# Altium schematic symbol library Semi-ATE.SchLib: 322 symbols (part 3 of 6)
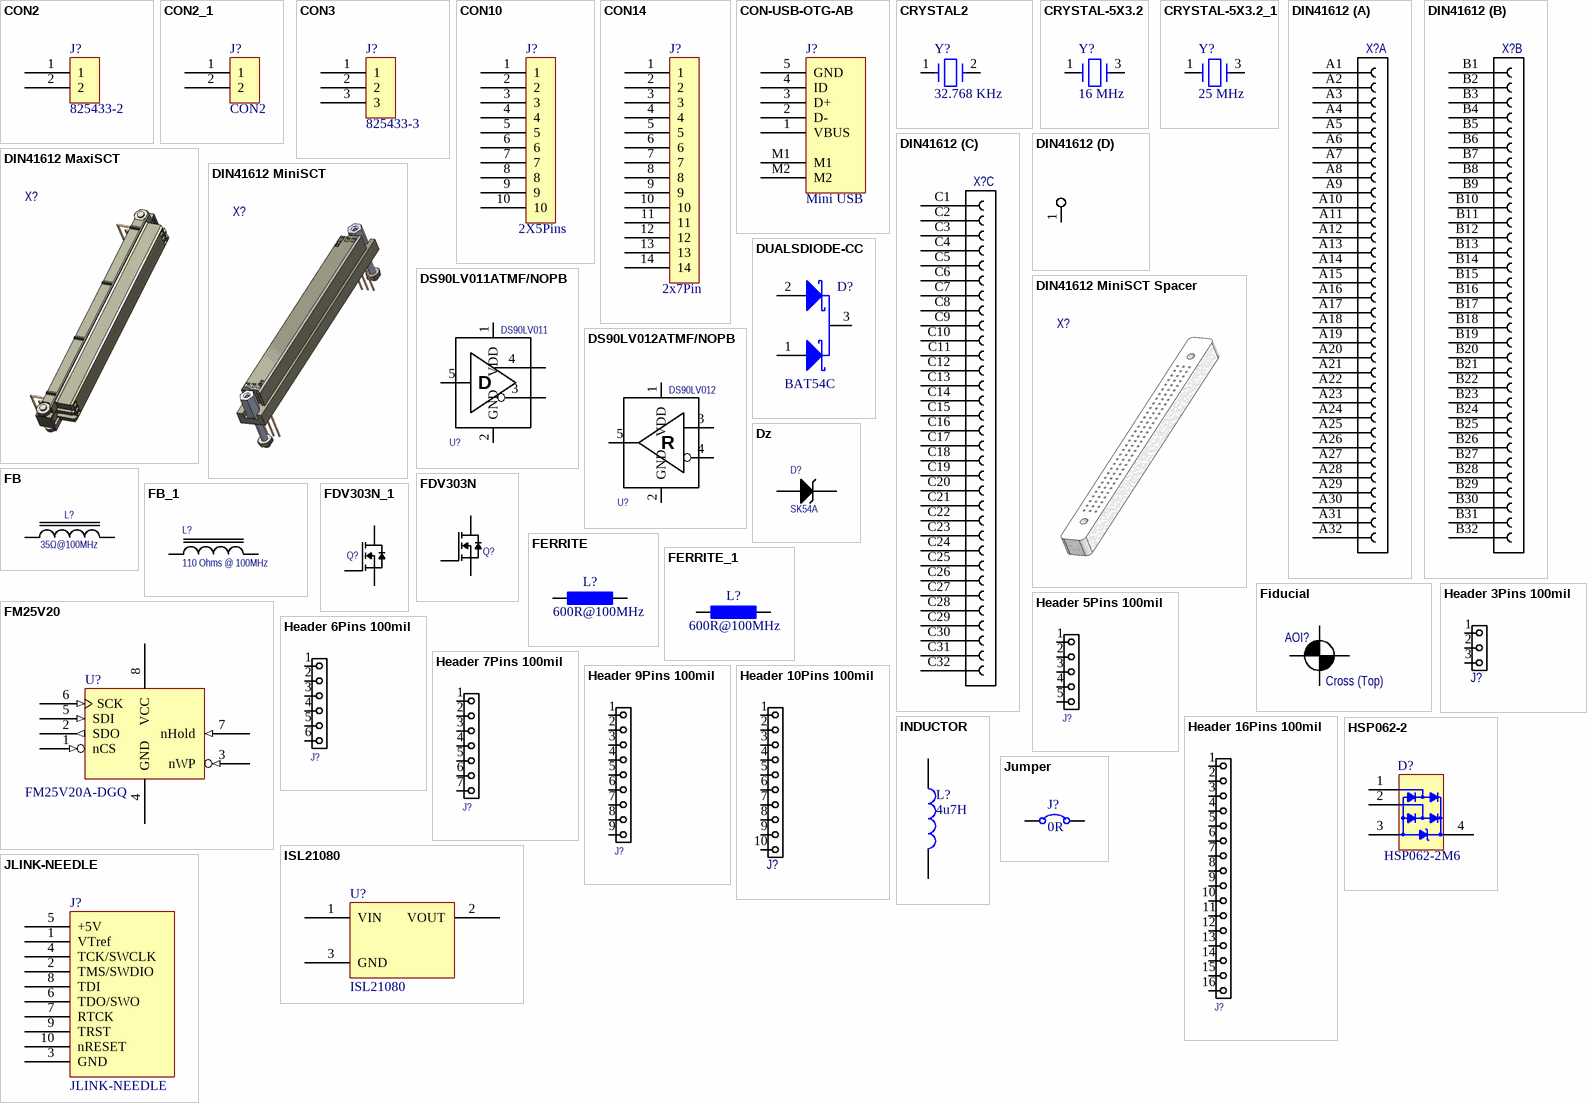
[diagram p21: symbols CON2 to Jumper]

## CON2_1
designator J?, comment NicName: CON2  (hidden comment: J)
CONN HEADER VERT 2POS 2.54MM + Lock; MFR-PN: 825433-2; MFR: TYCO; 04. Manufacturer: Molex; 07. Manufacturer  Part Number: 0022112022; POPULATED: no; 03. Unit Price: 0.35; 3D-Export: No; 01. Distributor: DigiKey; 02. Distributor Part Number: WM2700-ND; 11. RoHS: YES; ComponentLink4Description: Info; ComponentLink4URL: https://www.digikey.de/products/en/connectors-interconnects/rectangular-connectors-headers-male-pins/314?k=22112022; ComponentLink5Description: DataSheet; ComponentLink5URL: https://www.molex.com/pdm_docs/sd/022112022_sd.pdf
footprint MOLEX-22-11-2022
footprint TSW-1X2
pins: 1, 2

## CON3
designator J?, comment 07. Manufacturer  Part Number: 825433-3  (hidden comment: J)
CONN HEADER VERT 3POS 2.54MM; MFR: TYCO; 04. Manufacturer: TE Connectivity AMP Connectors; POPULATED: no; 03. Unit Price: 0.54; 3D-Export: No; MFR-PN: 825433-3; 01. Distributor: DigiKey; 02. Distributor Part Number: A106465-ND; 09. Operating Temperature: -65°C ~ 105°C; 11. RoHS: YES; ComponentLink4Description: Info; ComponentLink4URL: https://www.digikey.de/products/en/connectors-interconnects/rectangular-connectors-headers-male-pins/314?k=825433-2&k=&pkeyword=825433-2&sv=0&pv88=2&sf=0&quantity=&ColumnSort=0&page=1&pageSize=25; ComponentLink5Description: DataSheet; ComponentLink5URL: https://www.te.com/commerce/DocumentDelivery/DDEController?Action=srchrtrv&DocNm=825433&DocType=Customer+Drawing&DocLang=English
footprint TSW-1X3 (Footprint not found)
pins: 1, 2, 3

## CON10
designator J?, comment NicName: 2X5Pins  (hidden comment: J)
CONN HEADER VERT 10POS 2.54MM; MFR-PN: 09 18 510 6324; MFR: HARTING; 07. Manufacturer  Part Number: 09185106324; POPULATED: yes; 03. Unit Price: 1.34; 3D-Export: No; 01. Distributor: DigiKey; 02. Distributor Part Number: 1195-1672-ND; 04. Manufacturer: HARTING; 09. Operating Temperature: -55°C ~ 125°C; 11. RoHS: YES; ComponentLink4Description: Info; ComponentLink4URL: https://www.digikey.de/products/en/connectors-interconnects/rectangular-connectors-headers-male-pins/314?k=09%2018%20510%206324; ComponentLink5Description: DataSheet; ComponentLink5URL: https://b2b.harting.com/files/download/PRD/PDF_TS/09185XXX324_100154466DRW008A.pdf
footprint SEK10GW
pins: 1, 2, 3, 4, 5, 6, 7, 8, 9, 10

## CON14
designator J?, comment NicName: 2x7Pin  (hidden comment: J)
CONN HEADER VERT 14POS 2MM; MFR: SAMTEC; MFR-PN: LTMM-107-02-F-D; MFR-TYPE: LTMM; 04. Manufacturer: Samtec Inc.; POPULATED: yes; 03. Unit Price: 2.07; 3D-Export: No; 01. Distributor: Samtec Inc.; 02. Distributor Part Number: LTMM-107-02-F-D; 07. Manufacturer  Part Number: LTMM-107-02-F-D; 11. RoHS: YES; ComponentLink4Description: Info; ComponentLink4URL: https://www.samtec.com/products/ltmm-107-02-f-d
footprint LTM-V-14
pins: 1, 2, 3, 4, 5, 6, 7, 8, 9, 10, 11, 12, 13, 14

## CON-USB-OTG-AB
designator J?, comment NicName: Mini USB  (hidden comment: J)
CONN RCPT USB2.0 MINI B VERT; MFR-PN: 0565790519; MFR: MOLEX; 07. Manufacturer  Part Number: 5000751517; POPULATED: yes; 03. Unit Price: 4.04; 3D-Export: No; Temperature Range: -20°C/+85°C; 01. Distributor: DigiKey; 02. Distributor Part Number: WM2072-ND; 04. Manufacturer: Molex; 09. Operating Temperature: -40°C ~ 85°C; 11. RoHS: YES; ComponentLink4Description: Info; ComponentLink4URL: https://www.digikey.de/products/en?keywords=WM2072-ND; ComponentLink5Description: DataSheet; ComponentLink5URL: https://www.molex.com/pdm_docs/sd/5000751517_sd.pdf
footprint MOLEX-5000751517
pins: 1 VBUS, 2 D-, 3 D+, 4 ID, 5 GND, M1, M2

## CRYSTAL2
designator Y?, comment value 32.768 KHz  (hidden comment: Y)
32.768 KHz XTAL; MFR: EUROQUARTZ; MFR-PN: PH32768S; POPULATED: yes; 03. Unit Price: 0.502; 3D-Export: No; Temperature Range: -40°C/+85°C; 01. Distributor: Farnell; 02. Distributor Part Number: 1641088; 04. Manufacturer: EUROQUARTZ; 07. Manufacturer  Part Number: PH32768S; 09. Operating Temperature: -40°C~+85°C; 11. RoHS: YES; ComponentLink4Description: Info; ComponentLink4URL: https://de.farnell.com/euroquartz/ph32768x/quarz-3x8mm-plt-32-768khz-12-5/dp/1641088?ost=1641088&ddkey=https%3Ade-DE%2FElement14_Germany%2Fsearch; ComponentLink5Description: DataSheet; ComponentLink5URL: http://www.farnell.com/datasheets/1322436.pdf?_ga=2.76528336.455496259.1554557825-1796319186.1516204025&_gac=1.191945176.1554557825.Cj0KCQjwnKHlBRDLARIsAMtMHDEqbRXRqjZhpdX2XgffLKCo5B_j81vh-gSBYYE2_w1VQzz4pZXVC3caAvMVEALw_wcB
footprint FC
pins: 1, 2

## CRYSTAL-5X3.2
designator Y?, comment value 16 MHz  (hidden comment: Y)
CRYSTAL 16.0000MHZ 18PF SMD; MFR: ABRACON; MFR-PN: ABM3B-16.000MHZ-B2-T; 04. Manufacturer: Abracon LLC; Parameters: CL=18pF, 50ppm; POPULATED: yes; 03. Unit Price: 0.56; 3D-Export: No; Temperature Range: -40°C/+85°C; 01. Distributor: DigiKey; 02. Distributor Part Number: 535-9122-6-ND; 07. Manufacturer  Part Number: ABM3B-16.000MHZ-B2-T; 09. Operating Temperature: -20°C ~ 70°C; 11. RoHS: YES; ComponentLink4Description: Info; ComponentLink4URL: https://www.digikey.de/products/en?keywords=535-9122-6-ND; ComponentLink5Description: DataSheet; ComponentLink5URL: https://abracon.com/Resonators/abm3b.pdf
footprint XTAL(Q)5x3.2
pins: 1, 3

## CRYSTAL-5X3.2_1
designator Y?, comment value 25 MHz  (hidden comment: Y)
CRYSTAL 25.0000MHZ 18PF SMD; MFR: ABRACON; MFR-PN: ABM3B-25.000MHZ-B2-T; 04. Manufacturer: Abracon LLC; POPULATED: yes; 03. Unit Price: 0.56; 3D-Export: No; 01. Distributor: DigiKey; 02. Distributor Part Number: 535-9128-6-ND; 07. Manufacturer  Part Number: ABM3B-25.000MHZ-B2-T; 09. Operating Temperature: -20°C ~ 70°C; 11. RoHS: YES; ComponentLink4Description: Info; ComponentLink4URL: https://www.digikey.de/products/en?keywords=535-9128-6-ND; ComponentLink5Description: DataSheet; ComponentLink5URL: https://abracon.com/Resonators/abm3b.pdf
footprint XTAL(Q)5x3.2
pins: 1, 3

## DIN41612
designator X?, comment X  (value not drawn)  (no BOM)
DIN-SIGNAL; 04. Manufacturer: Harting; 13. Created Date/Name: NOV2018 / Hören; System: Connector; 3D-Export: Yes; 01. Distributor: DigiKey
footprint DIN 41612
part A pins: A1, A2, A3, A4, A5, A6, A7, A8, A9, A10, A11, A12, A13, A14, A15, A16, A17, A18, A19, A20, A21, A22, A23, A24, A25, A26, A27, A28, A29, A30, A31, A32
part B pins: B1, B2, B3, B4, B5, B6, B7, B8, B9, B10, B11, B12, B13, B14, B15, B16, B17, B18, B19, B20, B21, B22, B23, B24, B25, B26, B27, B28, B29, B30, B31, B32
part C pins: C1, C2, C3, C4, C5, C6, C7, C8, C9, C10, C11, C12, C13, C14, C15, C16, C17, C18, C19, C20, C21, C22, C23, C24, C25, C26, C27, C28, C29, C30, C31, C32
part D pins: 1

## DIN41612 MaxiSCT
designator X?, comment X  (value not drawn)
DIN-SIGNAL R096FS-3,0C1-2; 04. Manufacturer: Harting; 07. Manufacturer  Part Number: 09732966801; 03. Unit Price: 4.33; 13. Created Date/Name: NOV2018 / Hören; System: Connector; 3D-Export: Yes; 01. Distributor: DigiKey; 02. Distributor Part Number: 1195-2893-ND; 11. RoHS: YES; ComponentLink1Description: Info; ComponentLink1URL: https://www.digikey.de/product-detail/en/harting/09732966801/1195-2893-ND/3181477; ComponentLink2Description: DataSheet; ComponentLink2URL: https://b2b.harting.com/files/download/PRD/PDF_TS/0973296X801_100104712DRW068A.pdf
footprint DIN 41612 MaxiSCT (09732966801)

## DIN41612 MiniSCT
designator X?, comment X  (value not drawn)
DIN-SIGNAL C096FPW-13,2C1-1; 04. Manufacturer: Harting; 07. Manufacturer  Part Number: 09032962861; 03. Unit Price: 8.81; 13. Created Date/Name: NOV2018 / Hören; System: Connector; 3D-Export: Yes; 01. Distributor: DigiKey; 02. Distributor Part Number: 1195-1192-ND; 09. Operating Temperature: -40°C ~ 105°C; 11. RoHS: YES; ComponentLink1Description: Info; ComponentLink1URL: https://www.digikey.de/products/en?keywords=09032962861; ComponentLink2Description: DataSheet; ComponentLink2URL: https://b2b.harting.com/files/download/PRD/PDF_TS/0903296X861_100072194DRW085D.pdf
footprint DIN 41612 MiniSCT (09032962861)

## DIN41612 MiniSCT Spacer
designator X?, comment X  (value not drawn)
DIN-SIGNAL C096FPW-13,2C1-1 Spacer; 04. Manufacturer: Likom; 03. Unit Price: 0; 13. Created Date/Name: NOV2018 / Hören; 3D-Export: Yes; 01. Distributor: N/A; 11. RoHS: YES; ComponentLink1Description: Info; ComponentLink1URL: https://www.digikey.de/products/en?keywords=09032962861; ComponentLink2Description: DataSheet; ComponentLink2URL: https://b2b.harting.com/files/download/PRD/PDF_TS/0903296X861_100072194DRW085D.pdf
footprint DIN 41612 MiniSCT Spacer (09032962861)

## DS90LV011ATMF/NOPB
designator U?, comment NicName: DS90LV011  (hidden comment: U)
1/0 Driver  LVDS SOT-23-5; 04. Manufacturer: Texas Instruments; 07. Manufacturer  Part Number: DS90LV011ATMF/NOPB; 03. Unit Price: 0.43; 13. Created Date/Name: AUG 2018 / Hören; 01. Distributor: DigiKey; 02. Distributor Part Number: DS90LV011ATMF/NOPBTR-ND; 11. RoHS: YES; ComponentLink1Description: Info; ComponentLink1URL: https://www.digikey.de/products/en?keywords=DS90LV011ATMF%2FNOPBTR-ND; ComponentLink2Description: DataSheet; ComponentLink2URL: https://www.ti.com/general/docs/suppproductinfo.tsp?distId=10&gotoUrl=http%3A%2F%2Fwww.ti.com%2Flit%2Fgpn%2Fds90lv011a; Package: SOT23-5
footprint SOT23-5 (SOT 23 5 lead)
pins: 1 VDD, 2 GND, 3 OUT-, 4 OUT+, 5 TTL_IN
text: D

## DS90LV012ATMF/NOPB
designator U?, comment NicName: DS90LV012  (hidden comment: U)
0/1 Receiver  LVDS SOT-23-5; 04. Manufacturer: Texas Instruments; 07. Manufacturer  Part Number: DS90LV012ATMF/NOPB; 03. Unit Price: 0.35; 13. Created Date/Name: AUG 2018 / Hören; 01. Distributor: DigiKey; 02. Distributor Part Number: DS90LV012ATMF/NOPBTR-ND; 11. RoHS: YES; ComponentLink1Description: Info; ComponentLink1URL: https://www.digikey.de/products/en?keywords=DS90LV012ATMF%2FNOPBTR-ND; ComponentLink2Description: DataSheet; ComponentLink2URL: https://www.ti.com/lit/ds/symlink/ds90lt012a.pdf?HQS=dis-dk-null-digikeymode-dsf-pf-null-wwe&ts=1611423055418; Package: SOT23-5
footprint SOT23-5 (SOT 23 5 lead)
pins: 1 VDD, 2 GND, 3 IN+, 4 IN-, 5 TTL_OUT
text: R

## DUALSDIODE-CC
designator D?, comment 07. Manufacturer  Part Number: BAT54C  (hidden comment: D)
DIODE ARRAY SCHOTTKY 30V SOT23-3; 04. Manufacturer: ON Semiconductor; POPULATED: yes; 03. Unit Price: 0.23; 3D-Export: No; Temperature Range: -55°C ~ 150°C; 01. Distributor: DigiKey; 02. Distributor Part Number: BAT54CFSCT-ND; 09. Operating Temperature: -55°C ~ 150°C; 11. RoHS: YES; ComponentLink4Description: Info; ComponentLink4URL: https://www.digikey.de/product-detail/en/on-semiconductor/BAT54C/BAT54CFSCT-ND/458929; ComponentLink5Description: DataSheet; ComponentLink5URL: https://media.digikey.com/pdf/Data%20Sheets/ON%20Semiconductor%20PDFs/BAT54(A,C,S).pdf
footprint SOT23
pins: 1 A, 2 K, 3 C

## Dz
designator D?, comment NickName: SK54A  (hidden comment: D)
DIODE SCHOTTKY 5A 40V SMA; 04. Manufacturer: Micro Commercial Co; 07. Manufacturer  Part Number: SK54A-LTP; 03. Unit Price: 0.48; 13. Created Date/Name: AUG2018/Hören; 3D-Export: No; 01. Distributor: DigiKey; 02. Distributor Part Number: SK54A-LTPMSCT-ND; 09. Operating Temperature: -55°C ~ 150°C; 11. RoHS: YES; ComponentLink1Description: Info; ComponentLink1URL: https://www.digikey.de/products/en?keywords=SK54A-LTPMSCT-ND; ComponentLink2Description: DataSheet; ComponentLink2URL: https://www.mccsemi.com/pdf/Products/SK52A-L-SK510A-L(DO-214AC).pdf; Package: DO-214AC
footprint SOD128 (PMEG4050EP,115)
footprint DO-214AC (DO-214AC entspricht SMA)
pins: 1 A, 2 C

## FB
designator L?, comment value 35Ω@100MHz  (hidden comment: L)
FERRITE BEAD 50 OHM 1206 1LN; 04. Manufacturer: Murata Electronics North America; 07. Manufacturer  Part Number: BLM31PG500SN1L; DC Resistance: 15mΩ; Impedance Tolerance: %; 03. Unit Price: 0.28; 13. Created Date/Name: AUG2018/Hören; 3D-Export: No; Nominal Impedance: 35Ω@100MHz; ComponentLink1Description: Info; ComponentLink1URL: https://www.digikey.de/product-detail/en/murata-electronics-north-america/BLM31PG500SN1L/490-1055-6-ND/1826162; ComponentLink2Description: DataSheet; ComponentLink2URL: https://www.murata.com/en-us/products/productdata/8796739698718/ENFA0006.pdf; 02. Distributor Part Number: 490-1055-6-ND; 09. Operating Temperature: -55°C ~ 125°C; 11. RoHS: YES; 01. Distributor: DigiKey
footprint FB0805
footprint FB1206 (SMT Ferrite Bead 1206)
footprint L1206
pins: 1, 2

## FB_1
designator L?, comment value 110 Ohms @ 100MHz  (hidden comment: L)
FERRITE BEAD 110 OHM 0603 1LN; 04. Manufacturer: Wurth Electronics Inc.; 07. Manufacturer  Part Number: 74279228111; Nominal Impedance: Ω; DCR: 20mΩ; Impedance Tolerance: %; 03. Unit Price: 0.28; 13. Created Date/Name: AUG2018/Hören; IRMS: 4.1A; 3D-Export: No; ComponentLink1Description: Info; ComponentLink1URL: https://www.digikey.de/products/en?keywords=732-6116-6-ND; ComponentLink2Description: DataSheet; ComponentLink2URL: https://katalog.we-online.de/pbs/datasheet/74279228111.pdf; 02. Distributor Part Number: 732-6116-6-ND; 09. Operating Temperature: -55°C ~ 125°C; 11. RoHS: YES; 01. Distributor: DigiKey; ISAT: *; Package: 0603; Tolerance: *
footprint FB0603 (SMT Ferrite Bead 0603)
footprint FB0805 (SMT Ferrite Bead 0805)
footprint FB1206 (SMT Ferrite Bead 1206)
pins: 1, 2

## FDV303N
designator Q?, comment Q  (value not drawn)
MOSFET N-CH 25V 680MA SOT-23; 04. Manufacturer: ON Semiconductor; 07. Manufacturer  Part Number: FDV303N; 03. Unit Price: 0.41; 13. Created Date/Name: AUG 2018 / Hören; Rds On: 450 mΩ @ id=500mA & Vgs=4.5V; Vgs,th: 1.5V @ 250uA; Power Rating: 350mW; 3D-Export: No; 01. Distributor: DigiKey; 02. Distributor Part Number: FDV303NDKR-ND; 09. Operating Temperature: -55°C ~ 150°C (TJ); 11. RoHS: YES; ComponentLink1Description: Info; ComponentLink1URL: https://www.digikey.de/product-detail/en/on-semiconductor/FDV303N/FDV303NDKR-ND/1630434; ComponentLink2Description: DataSheet; ComponentLink2URL: https://media.digikey.com/pdf/Data%20Sheets/Fairchild%20PDFs/FDV303N.pdf; Vdss: 25V; Id: 680mA
footprint SOT23-3
pins: 1 G, 2 S, 3 D

## FDV303N_1
designator Q?, comment Q  (value not drawn)
MOSFET N-Channel; 04. Manufacturer: ON Semiconductor; 07. Manufacturer  Part Number: FDV303N; 03. Unit Price: 0.41; 13. Created Date/Name: AUG 2018 / Hören; Rds On: 450 mΩ @ id=500mA & Vgs=4.5V; Vgs,th: 1.5V @ 250uA; Vdss: 25V; Id: 680mA; Power Rating: 350mW; Design: AWGDIG; 3D-Export: No; 01. Distributor: DigiKey; 02. Distributor Part Number: FDV303NDKR-ND; 09. Operating Temperature: -55°C ~ 150°C (TJ); 11. RoHS: YES; ComponentLink1Description: Info; ComponentLink1URL: https://www.digikey.de/product-detail/en/on-semiconductor/FDV303N/FDV303NDKR-ND/1630434; ComponentLink2Description: DataSheet; ComponentLink2URL: https://media.digikey.com/pdf/Data%20Sheets/Fairchild%20PDFs/FDV303N.pdf
footprint SOT23-3
pins: 1 G, 2 S, 3 D

## FERRITE
designator L?, comment value 600R@100MHz  (hidden comment: L)
FERRITE BEAD 600 OHM 0805 1LN; MFR-PN: 742792040; MFR: WUERTH; 04. Manufacturer: Wurth Electronics Inc.; POPULATED: yes; PARAMETERS: Idc=2A, Rdc=0.15R; 03. Unit Price: 0.21; 3D-Export: No; Temperature Range: -55°C ~ 125°C; 07. Manufacturer  Part Number: 742792040; 01. Distributor: DigiKey; 02. Distributor Part Number: 732-1620-6-ND; 09. Operating Temperature: -55°C ~ 125°C; 11. RoHS: YES; ComponentLink4Description: Info; ComponentLink4URL: https://www.digikey.de/products/en/filters/ferrite-beads-and-chips/841?k=742792040&k=&pkeyword=742792040&sv=0&pv7=243&sf=0&quantity=&ColumnSort=0&page=1&pageSize=25; ComponentLink5Description: DataSheet; ComponentLink5URL: https://katalog.we-online.de/pbs/datasheet/742792040.pdf
footprint L0805
pins: 1, 2

## FERRITE_1
designator L?, comment value 600R@100MHz  (hidden comment: L)
FERRITE BEAD 600 OHM 0603 1LN; MFR-PN: 742792040; MFR: WUERTH; 04. Manufacturer: Murata Electronics North America; 07. Manufacturer  Part Number: BLM18KG601SN1D; Parameters: Idc=2A, Rdc=0.15R; POPULATED: yes; 03. Unit Price: 0.09; 3D-Export: No; Temperature Range: -55°C ~ 125°C; 01. Distributor: DigiKey; 02. Distributor Part Number: 490-5258-6-ND; 09. Operating Temperature: -55°C ~ 125°C; 11. RoHS: YES; ComponentLink4Description: Info; ComponentLink4URL: https://www.digikey.de/product-detail/en/murata-electronics-north-america/BLM18KG601SN1D/490-5258-6-ND/1982796; ComponentLink5Description: DataSheet; ComponentLink5URL: https://media.digikey.com/pdf/Data%20Sheets/Murata%20PDFs/BLM18yyyyyyN1x.pdf
footprint L0805
footprint L0603
pins: 1, 2

## Fiducial
designator AOI?  Shape: Cross (Top)  (hidden comment: Fiducial)  (no BOM)
Assembly AOI; 13. Created Date/Name: AUG2018/Hören; 3D-Export: No; 01. Distributor: N/A; 02. Distributor Part Number: N/A; 03. Unit Price: N/A; 04. Manufacturer: N/A; 05. Quantity: N/A; 06. Data Sheet: N/A; 07. Manufacturer  Part Number: N/A; 08. Inhouse Stock: N/A; 09. Operating Temperature: N/A; 10. Weight: N/A; 11. RoHS: N/A; 12.UL94 Flammability: N/A; ComponentLink1Description: Info; ComponentLink2Description: Info; ComponentLink3Description: FootPrint
footprint Fiducial Cross
footprint Fiducial Point

## FM25V20
designator U?, comment 07. Manufacturer  Part Number: FM25V20A-DGQ  (hidden comment: U)
IC FRAM 2M SPI 40MHZ 8TDFN; MFR: CYPRESS; 04. Manufacturer: Cypress Semiconductor Corp; POPULATED: yes; 03. Unit Price: 15.14; 3D-Export: No; MFR-PN: FM25V20A-DGQ; Temperature Range: -40°C/+85°C; 01. Distributor: DigiKey; 02. Distributor Part Number: 428-3378-5-ND; 09. Operating Temperature: -40°C ~ 105°C (TA); 11. RoHS: YES; ComponentLink4Description: Info; ComponentLink4URL: https://www.digikey.de/product-detail/en/cypress-semiconductor-corp/FM25V20A-DGQ/428-3378-5-ND/5113877; ComponentLink5Description: DataSheet; ComponentLink5URL: https://www.cypress.com/file/136076/download
footprint TDFN8
pins: 1 nCS (in), 2 SDO (out), 3 nWP (in), 4 GND (power), 5 SDI (in), 6 SCK (in), 7 nHold (in), 8 VCC (power)

## Header 3Pins 100mil
designator J?, comment J  (value not drawn)
CONN HEADER VERT 3POS 2.54MM; 04. Manufacturer: Samtec Inc.; 07. Manufacturer  Part Number: HMTSW-103-07-G-S-240; 03. Unit Price: 0.25; 13. Created Date/Name: AUG2018/Hören; 3D-Export: No; 01. Distributor: Samtec Inc.; 02. Distributor Part Number: HMTSW-103-07-G-S-240; 11. RoHS: YES; ComponentLink1Description: Info; ComponentLink1URL: https://www.samtec.com/products/hmtsw-103-07-g-s-240; ComponentLink2Description: DataSheet; ComponentLink2URL: http://suddendocs.samtec.com/catalog_english/hmtsw.pdf
footprint Header 100mil 3x1 (HMTSW-103-07-G-S-240)
footprint CONNECTOR 100MIL 3x1
pins: 1, 2, 3

## Header 5Pins 100mil
designator J?, comment J  (value not drawn)
CONN HEADER VERT 5POS 2.54MM; 04. Manufacturer: Samtec Inc.; 07. Manufacturer  Part Number: HMTSW-105-07-G-S-240; 03. Unit Price: 0.42; 13. Created Date/Name: AUG2018/Hören; 3D-Export: No; 01. Distributor: Samtec Inc.; 02. Distributor Part Number: HMTSW-105-07-G-S-240; 11. RoHS: YES; ComponentLink1Description: Info; ComponentLink1URL: https://www.samtec.com/products/hmtsw-105-07-g-s-240; ComponentLink2Description: DataSheet; ComponentLink2URL: http://suddendocs.samtec.com/catalog_english/hmtsw.pdf
footprint Header 100mil 5x1 (HMTSW-105-07-G-S-240)
pins: 1, 2, 3, 4, 5

## Header 6Pins 100mil
designator J?, comment J  (value not drawn)
CONN HEADER VERT 6POS 2.54MM; 04. Manufacturer: Samtec Inc.; 07. Manufacturer  Part Number: HMTSW-106-07-G-S-240; 03. Unit Price: 0.25; 13. Created Date/Name: AUG2018/Hören; 3D-Export: No; 01. Distributor: Samtec Inc.; 02. Distributor Part Number: HMTSW-106-07-G-S-240; 11. RoHS: YES; ComponentLink1Description: Info; ComponentLink1URL: https://www.samtec.com/products/hmtsw-106-07-g-s-240; ComponentLink2Description: DataSheet; ComponentLink2URL: http://suddendocs.samtec.com/catalog_english/hmtsw.pdf
footprint Header 100mil 6x1 (HMTSW-106-07-G-S-240)
pins: 1, 2, 3, 4, 5, 6

## Header 7Pins 100mil
designator J?, comment J  (value not drawn)
CONN HEADER VERT 7POS 2.54MM; 04. Manufacturer: Samtec Inc.; 07. Manufacturer  Part Number: HMTSW-107-07-G-S-240; 03. Unit Price: 0.25; 13. Created Date/Name: AUG2018/Hören; 3D-Export: No; 01. Distributor: Samtec Inc.; 02. Distributor Part Number: HMTSW-107-07-G-S-240; 11. RoHS: YES; ComponentLink1Description: Info; ComponentLink1URL: https://www.samtec.com/products/HMTSW-107-07-G-S-240; ComponentLink2Description: DataSheet; ComponentLink2URL: http://suddendocs.samtec.com/catalog_english/hmtsw.pdf
footprint Header 100mil 7x1 (HMTSW-107-07-G-S-240)
pins: 1, 2, 3, 4, 5, 6, 7

## Header 9Pins 100mil
designator J?, comment J  (value not drawn)
CONN HEADER VERT 9POS 2.54MM; 04. Manufacturer: Samtec Inc.; 07. Manufacturer  Part Number: HMTSW-109-07-G-S-240; 03. Unit Price: 0.25; 13. Created Date/Name: AUG2018/Hören; 3D-Export: No; 01. Distributor: Samtec Inc.; 02. Distributor Part Number: HMTSW-109-07-G-S-240-ND; 11. RoHS: YES; ComponentLink1Description: Info; ComponentLink1URL: https://www.digikey.de/products/en?keywords=HMTSW-109-07-G-S-240; ComponentLink2Description: DataSheet; ComponentLink2URL: http://suddendocs.samtec.com/catalog_english/hmtsw.pdf
footprint Header 100mil 9x1 (HMTSW-109-07-G-S-240)
pins: 1, 2, 3, 4, 5, 6, 7, 8, 9

## Header 10Pins 100mil
designator J?, comment J  (value not drawn)
CONN HEADER VERT 10POS 2.54MM; 04. Manufacturer: Samtec Inc.; 07. Manufacturer  Part Number: HMTSW-110-07-G-S-240; 03. Unit Price: 0.84; 13. Created Date/Name: AUG2018/Hören; 3D-Export: No; 01. Distributor: Samtec Inc.; 02. Distributor Part Number: HMTSW-110-07-G-S-240; 11. RoHS: YES; ComponentLink1Description: Info; ComponentLink1URL: https://www.samtec.com/products/hmtsw-110-07-g-s-240; ComponentLink2Description: DataSheet; ComponentLink2URL: http://suddendocs.samtec.com/catalog_english/hmtsw.pdf
footprint Header 100mil 10x1 (HMTSW-110-07-G-S-240)
pins: 1, 2, 3, 4, 5, 6, 7, 8, 9, 10

## Header 16Pins 100mil
designator J?, comment J  (value not drawn)
CONN HEADER VERT 16POS 2.54MM; 04. Manufacturer: Samtec Inc.; 07. Manufacturer  Part Number: HMTSW-116-07-G-S-240; 03. Unit Price: 0.25; 13. Created Date/Name: AUG2018/Hören; 3D-Export: No; 01. Distributor: Samtec Inc.; 02. Distributor Part Number: HMTSW-116-07-G-S-240; 11. RoHS: YES; ComponentLink1Description: Info; ComponentLink1URL: https://www.samtec.com/search/hmtsw-116-07-g-s-240; ComponentLink2Description: DataSheet; ComponentLink2URL: http://suddendocs.samtec.com/catalog_english/hmtsw.pdf
footprint Header 100mil 16x1 (HMTSW-116-07-G-S-240)
pins: 1, 2, 3, 4, 5, 6, 7, 8, 9, 10, 11, 12, 13, 14, 15, 16

## HSP062-2
designator D?, comment 07. Manufacturer  Part Number: HSP062-2M6  (hidden comment: D)
TVS DIODE 3V 18V 6UQFN; MFR: ST; 04. Manufacturer: STMicroelectronics; POPULATED: yes; 03. Unit Price: 0.243; 3D-Export: No; MFR-PN: HSP062-2M6; 01. Distributor: DigiKey; 02. Distributor Part Number: 497-12962-6-ND; 09. Operating Temperature: -40°C ~ 150°C (TJ); 11. RoHS: YES; ComponentLink4Description: Info; ComponentLink4URL: https://www.digikey.de/products/en/circuit-protection/tvs-diodes/144?k=HSP062-2M6&k=&pkeyword=HSP062-2M6&sv=0&pv7=243&sf=0&quantity=&ColumnSort=0&page=1&pageSize=25; ComponentLink5Description: DataSheet; ComponentLink5URL: https://www.st.com/content/ccc/resource/technical/document/datasheet/90/b8/52/a8/c1/74/40/7f/DM00047941.pdf/files/DM00047941.pdf/jcr:content/translations/en.DM00047941.pdf
footprint ST-uQFN6 (Footprint not found)
pins: 1 I/O1, 2 I/O2, 3 I/O1, 4 VBUS

## INDUCTOR
designator L?, comment value 4u7H  (hidden comment: L)
FIXED IND 4.7UH 2.8A 65 MOHM SMD; MFR-PN: 7447786004; MFR: WUERTH; 04. Manufacturer: Wurth Electronics Inc.; POPULATED: yes; Parameters: Isat=2.8A, Idc=2.8A, DRC=65mR; 03. Unit Price: 2.33; 3D-Export: No; 01. Distributor: DigiKey; 02. Distributor Part Number: 732-3296-6-ND; 07. Manufacturer  Part Number: 7447786004; 09. Operating Temperature: -40°C ~ 125°C; 11. RoHS: YES; ComponentLink1Description: Info; ComponentLink1URL: https://www.digikey.de/products/en/inductors-coils-chokes/fixed-inductors/71?k=7447786004&k=&pkeyword=7447786004&sv=0&pv7=243&sf=0&quantity=&ColumnSort=0&page=1&pageSize=25; ComponentLink2Description: DataSheet; ComponentLink2URL: https://katalog.we-online.de/pbs/datasheet/7447786004.pdf
footprint WE-PD-XS
pins: 1, 2

## ISL21080
designator U?, comment NicName: ISL21080  (hidden comment: U)
IC VREF SERIES 1.25V SOT23-3; MFR-PN: ISL21080DIH312Z-TK; MFR: Intersil; 04. Manufacturer: Renesas Electronics America Inc.; POPULATED: yes; 03. Unit Price: 1.43; 3D-Export: No; Temperature Range: -40°C/+85°C; 01. Distributor: DigiKey; 02. Distributor Part Number: ISL21080DIH312Z-TKDKR-ND; 07. Manufacturer  Part Number: ISL21080DIH312Z-TK; 09. Operating Temperature: -40°C ~ 85°C (TA); 11. RoHS: YES; ComponentLink4Description: Info; ComponentLink4URL: https://www.digikey.de/products/en/integrated-circuits-ics/pmic-voltage-reference/693?k=ISL21080DIH312Z-TK&k=&pkeyword=ISL21080DIH312Z-TK&sv=0&pv7=243&sf=0&quantity=&ColumnSort=0&page=1&pageSize=25; ComponentLink5Description: DataSheet; ComponentLink5URL: http://www.intersil.com/content/dam/Intersil/documents/isl2/isl21080.pdf
footprint SOT23
pins: 1 VIN (power), 2 VOUT (hiz), 3 GND (power)

## JLINK-NEEDLE
designator J?, comment NicName: JLINK-NEEDLE  (hidden comment: J)  (no BOM)
10-PIN NEEDLE FOOTPRINT; POPULATED: yes; 3D-Export: No; ComponentLink4Description: Info; ComponentLink4URL: https://www.digikey.de/product-detail/en/segger-microcontroller-systems/8.06.05-10-PIN-NEEDLE-ADAPTER/8.06.0510-PINNEEDLEADAPTER-ND/3202465; ComponentLink5Description: DataSheet; ComponentLink5URL: https://www.segger.com/products/debug-probes/j-link/accessories/adapters/6-pin-needle-adapter/#tab-1647-4
footprint JLINK-NEEDLE
pins: 1 VTref, 2 TMS/SWDIO, 3 GND, 4 TCK/SWCLK, 5 +5V, 6 TDO/SWO, 7 RTCK, 8 TDI, 9 TRST, 10 nRESET

## Jumper
designator J?, comment value 0R  (hidden comment: J)
RES SMD 0 OHM JUMPER 1/10W 0603; 04. Manufacturer: Yageo; 07. Manufacturer  Part Number: RC0603JR-070RL; POPULATED: yes; 03. Unit Price: 0.09; 3D-Export: No; 01. Distributor: DigiKey; 02. Distributor Part Number: 311-0.0GRDKR-ND; 09. Operating Temperature: -55°C ~ 155°C; 11. RoHS: YES; ComponentLink4Description: Info; ComponentLink4URL: https://www.digikey.de/product-detail/en/yageo/RC0603JR-070RL/311-0.0GRDKR-ND/732569; ComponentLink5Description: DataSheet; ComponentLink5URL: http://www.yageo.com/documents/recent/PYu-RC_Group_51_RoHS_L_10.pdf
footprint JumperSMD (Chip Resistor, Body 1.6x0.8mm (LxW typ), IPC High Density)
pins: 1, 2

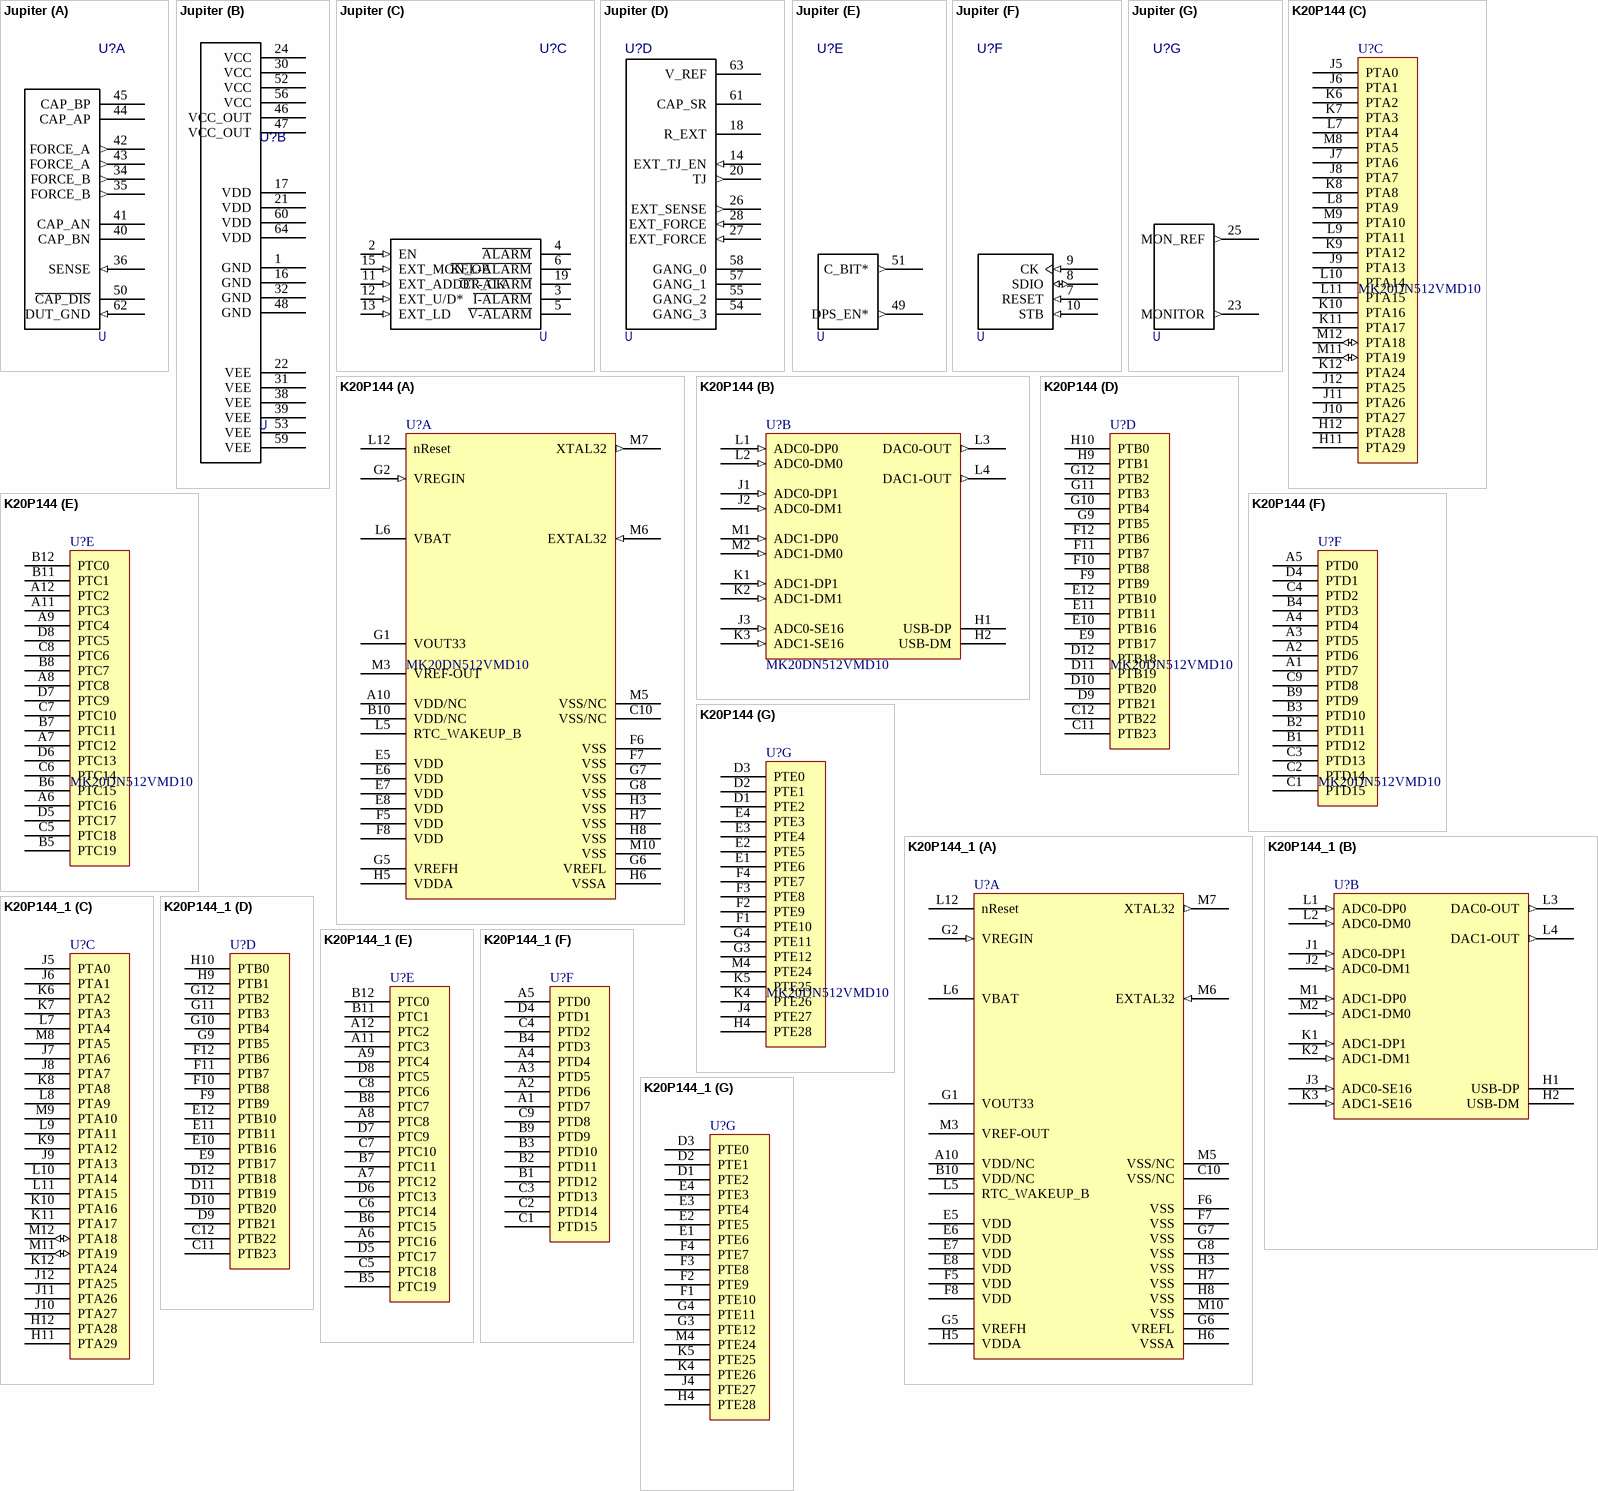
[diagram p8: symbols Jupiter to K20P144_1]

## Jupiter
designator U?, comment U
DPS; 04. Manufacturer: ElevATE; 07. Manufacturer  Part Number: Jupiter; 03. Unit Price: 75.0; 05. Quantity: 1; 13. Created Date/Name: AUG 2018 / Hören; 3D-Export: Yes; ComponentLink1Description: Info; 01. Distributor: ElevATE; 02. Distributor Part Number: Jupiter; 09. Operating Temperature: -25°C ~ 150°C; ComponentLink2Description: DataSheet
footprint Q64.10x10E
part A pins: 34 FORCE_B (out), 35 FORCE_B (out), 36 SENSE (in), 40 CAP_BN, 41 CAP_AN, 42 FORCE_A (out), 43 FORCE_A (out), 44 CAP_AP, 45 CAP_BP, 50 ~{CAP_DIS} (oc), 62 DUT_GND (in)
part B pins: 1 GND (power), 16 GND (power), 17 VDD (power), 21 VDD (power), 22 VEE (power), 24 VCC (power), 30 VCC (power), 31 VEE (power), 32 GND (power), 38 VEE (power), 39 VEE (power), 46 VCC_OUT (power), 47 VCC_OUT (power), 48 GND (power), 52 VCC (power), 53 VEE (power), 56 VCC (power), 59 VEE (power), 60 VDD (power), 64 VDD (power)
part C pins: 2 EN (in), 3 ~{I-ALARM}, 4 ~{ALARM}, 5 ~{V-ALARM}, 6 ~{KEL-ALARM}, 11 EXT_ADDER_CK (in), 12 EXT_U/D* (in), 13 EXT_LD (in), 15 EXT_MON_OE (in), 19 ~{OT-ALARM}
part D pins: 14 EXT_TJ_EN (in), 18 R_EXT, 20 TJ (out), 26 EXT_SENSE (out), 27 EXT_FORCE (in), 28 EXT_FORCE (in), 54 GANG_3, 55 GANG_2, 57 GANG_1, 58 GANG_0, 61 CAP_SR, 63 V_REF
part E pins: 49 DPS_EN* (out), 51 C_BIT* (out)
part F pins: 7 RESET (in), 8 SDIO (io), 9 CK (in), 10 STB (in)
part G pins: 23 MONITOR (out), 25 MON_REF (out)

## K20P144
designator U?, comment MK20DN512VMD10
IC MCU 32BIT 512KB FLASH 144BGA; MFR: FREESCALE; 04. Manufacturer: NXP USA Inc.; POPULATED: yes; 03. Unit Price: 10.27; 3D-Export: No; MFR-PN: MK20DN512VMD10; 01. Distributor: DigiKey; 02. Distributor Part Number: MK20DN512VMD10-ND; 07. Manufacturer  Part Number: MK20DN512VMD10; 09. Operating Temperature: -40°C ~ 105°C (TA); 11. RoHS: YES; Value: MK20DN512VMD10; ComponentLink4Description: Info; ComponentLink4URL: https://www.digikey.de/products/en?keywords=MK20DN512VMD10-ND; ComponentLink5Description: DataSheet; ComponentLink5URL: http://cache.freescale.com/files/32bit/doc/data_sheet/K20P144M100SF2V2.pdf
footprint MAPBGA144 (NXP BGA, 144-Leads, Body 13.00x13.00mmx1.70mm, Pitch 1.00mm (Document No: 98ASA00222D))
part A pins: A10 VDD/NC, B10 VDD/NC, C10 VSS/NC, E5 VDD (power), E6 VDD (power), E7 VDD (power), E8 VDD (power), F5 VDD (power), F6 VSS (power), F7 VSS (power), F8 VDD (power), G1 VOUT33, G2 VREGIN (in), G5 VREFH (power), G6 VREFL (power), G7 VSS (power), G8 VSS (power), H3 VSS (power), H5 VDDA (power), H6 VSSA (power), H7 VSS (power), H8 VSS (power), L5 RTC_WAKEUP_B, L6 VBAT (power), L12 nReset, M3 VREF-OUT, M5 VSS/NC, M6 EXTAL32 (in), M7 XTAL32 (out), M10 VSS (power)
part B pins: H1 USB-DP (hiz), H2 USB-DM (hiz), J1 ADC0-DP1 (in), J2 ADC0-DM1 (in), J3 ADC0-SE16 (in), K1 ADC1-DP1 (in), K2 ADC1-DM1 (in), K3 ADC1-SE16 (in), L1 ADC0-DP0 (in), L2 ADC0-DM0 (in), L3 DAC0-OUT (out), L4 DAC1-OUT (out), M1 ADC1-DP0 (in), M2 ADC1-DM0 (in)
part C pins: H11 PTA29 (hiz), H12 PTA28 (hiz), J5 PTA0 (hiz), J6 PTA1 (hiz), J7 PTA6 (hiz), J8 PTA7 (hiz), J9 PTA13 (hiz), J10 PTA27 (hiz), J11 PTA26 (hiz), J12 PTA25 (hiz), K6 PTA2 (hiz), K7 PTA3 (hiz), K8 PTA8 (hiz), K9 PTA12 (hiz), K10 PTA16 (hiz), K11 PTA17 (hiz), K12 PTA24 (hiz), L7 PTA4 (hiz), L8 PTA9 (hiz), L9 PTA11 (hiz), L10 PTA14 (hiz), L11 PTA15 (hiz), M8 PTA5 (hiz), M9 PTA10 (hiz), M11 PTA19 (io), M12 PTA18 (io)
part D pins: C11 PTB23 (hiz), C12 PTB22 (hiz), D9 PTB21 (hiz), D10 PTB20 (hiz), D11 PTB19 (hiz), D12 PTB18 (hiz), E9 PTB17 (hiz), E10 PTB16 (hiz), E11 PTB11 (hiz), E12 PTB10 (hiz), F9 PTB9 (hiz), F10 PTB8 (hiz), F11 PTB7 (hiz), F12 PTB6 (hiz), G9 PTB5 (hiz), G10 PTB4 (hiz), G11 PTB3 (hiz), G12 PTB2 (hiz), H9 PTB1 (hiz), H10 PTB0 (hiz)
part E pins: A6 PTC16 (hiz), A7 PTC12 (hiz), A8 PTC8 (hiz), A9 PTC4 (hiz), A11 PTC3 (hiz), A12 PTC2 (hiz), B5 PTC19 (hiz), B6 PTC15 (hiz), B7 PTC11 (hiz), B8 PTC7 (hiz), B11 PTC1 (hiz), B12 PTC0 (hiz), C5 PTC18 (hiz), C6 PTC14 (hiz), C7 PTC10 (hiz), C8 PTC6 (hiz), D5 PTC17 (hiz), D6 PTC13 (hiz), D7 PTC9 (hiz), D8 PTC5 (hiz)
part F pins: A1 PTD7 (hiz), A2 PTD6 (hiz), A3 PTD5 (hiz), A4 PTD4 (hiz), A5 PTD0 (hiz), B1 PTD12 (hiz), B2 PTD11 (hiz), B3 PTD10 (hiz), B4 PTD3 (hiz), B9 PTD9 (hiz), C1 PTD15 (hiz), C2 PTD14 (hiz), C3 PTD13 (hiz), C4 PTD2 (hiz), C9 PTD8 (hiz), D4 PTD1 (hiz)
part G pins: D1 PTE2 (hiz), D2 PTE1 (hiz), D3 PTE0 (hiz), E1 PTE6 (hiz), E2 PTE5 (hiz), E3 PTE4 (hiz), E4 PTE3 (hiz), F1 PTE10 (hiz), F2 PTE9 (hiz), F3 PTE8 (hiz), F4 PTE7 (hiz), G3 PTE12 (hiz), G4 PTE11 (hiz), H4 PTE28 (hiz), J4 PTE27 (hiz), K4 PTE26 (hiz), K5 PTE25 (hiz), M4 PTE24 (hiz)

## K20P144_1
designator U?
IC MCU 32BIT 512KB FLASH 144BGA; MFR-PN: MK20DN512VMD10; MFR: FREESCALE; 04. Manufacturer: NXP USA Inc.; POPULATED: yes; 03. Unit Price: 10.27; 3D-Export: No; 01. Distributor: DigiKey; 02. Distributor Part Number: MK20DN512VMD10-ND; 07. Manufacturer  Part Number: MK20DN512VMD10; 09. Operating Temperature: -40°C ~ 105°C (TA); 11. RoHS: YES
footprint MAPBGA144 (NXP BGA, 144-Leads, Body 13.00x13.00mmx1.70mm, Pitch 1.00mm (Document No: 98ASA00222D))
part A pins: A10 VDD/NC, B10 VDD/NC, C10 VSS/NC, E5 VDD (power), E6 VDD (power), E7 VDD (power), E8 VDD (power), F5 VDD (power), F6 VSS (power), F7 VSS (power), F8 VDD (power), G1 VOUT33, G2 VREGIN (in), G5 VREFH (power), G6 VREFL (power), G7 VSS (power), G8 VSS (power), H3 VSS (power), H5 VDDA (power), H6 VSSA (power), H7 VSS (power), H8 VSS (power), L5 RTC_WAKEUP_B, L6 VBAT (power), L12 nReset, M3 VREF-OUT, M5 VSS/NC, M6 EXTAL32 (in), M7 XTAL32 (out), M10 VSS (power)
part B pins: H1 USB-DP (hiz), H2 USB-DM (hiz), J1 ADC0-DP1 (in), J2 ADC0-DM1 (in), J3 ADC0-SE16 (in), K1 ADC1-DP1 (in), K2 ADC1-DM1 (in), K3 ADC1-SE16 (in), L1 ADC0-DP0 (in), L2 ADC0-DM0 (in), L3 DAC0-OUT (out), L4 DAC1-OUT (out), M1 ADC1-DP0 (in), M2 ADC1-DM0 (in)
part C pins: H11 PTA29 (hiz), H12 PTA28 (hiz), J5 PTA0 (hiz), J6 PTA1 (hiz), J7 PTA6 (hiz), J8 PTA7 (hiz), J9 PTA13 (hiz), J10 PTA27 (hiz), J11 PTA26 (hiz), J12 PTA25 (hiz), K6 PTA2 (hiz), K7 PTA3 (hiz), K8 PTA8 (hiz), K9 PTA12 (hiz), K10 PTA16 (hiz), K11 PTA17 (hiz), K12 PTA24 (hiz), L7 PTA4 (hiz), L8 PTA9 (hiz), L9 PTA11 (hiz), L10 PTA14 (hiz), L11 PTA15 (hiz), M8 PTA5 (hiz), M9 PTA10 (hiz), M11 PTA19 (io), M12 PTA18 (io)
part D pins: C11 PTB23 (hiz), C12 PTB22 (hiz), D9 PTB21 (hiz), D10 PTB20 (hiz), D11 PTB19 (hiz), D12 PTB18 (hiz), E9 PTB17 (hiz), E10 PTB16 (hiz), E11 PTB11 (hiz), E12 PTB10 (hiz), F9 PTB9 (hiz), F10 PTB8 (hiz), F11 PTB7 (hiz), F12 PTB6 (hiz), G9 PTB5 (hiz), G10 PTB4 (hiz), G11 PTB3 (hiz), G12 PTB2 (hiz), H9 PTB1 (hiz), H10 PTB0 (hiz)
part E pins: A6 PTC16 (hiz), A7 PTC12 (hiz), A8 PTC8 (hiz), A9 PTC4 (hiz), A11 PTC3 (hiz), A12 PTC2 (hiz), B5 PTC19 (hiz), B6 PTC15 (hiz), B7 PTC11 (hiz), B8 PTC7 (hiz), B11 PTC1 (hiz), B12 PTC0 (hiz), C5 PTC18 (hiz), C6 PTC14 (hiz), C7 PTC10 (hiz), C8 PTC6 (hiz), D5 PTC17 (hiz), D6 PTC13 (hiz), D7 PTC9 (hiz), D8 PTC5 (hiz)
part F pins: A1 PTD7 (hiz), A2 PTD6 (hiz), A3 PTD5 (hiz), A4 PTD4 (hiz), A5 PTD0 (hiz), B1 PTD12 (hiz), B2 PTD11 (hiz), B3 PTD10 (hiz), B4 PTD3 (hiz), B9 PTD9 (hiz), C1 PTD15 (hiz), C2 PTD14 (hiz), C3 PTD13 (hiz), C4 PTD2 (hiz), C9 PTD8 (hiz), D4 PTD1 (hiz)
part G pins: D1 PTE2 (hiz), D2 PTE1 (hiz), D3 PTE0 (hiz), E1 PTE6 (hiz), E2 PTE5 (hiz), E3 PTE4 (hiz), E4 PTE3 (hiz), F1 PTE10 (hiz), F2 PTE9 (hiz), F3 PTE8 (hiz), F4 PTE7 (hiz), G3 PTE12 (hiz), G4 PTE11 (hiz), H4 PTE28 (hiz), J4 PTE27 (hiz), K4 PTE26 (hiz), K5 PTE25 (hiz), M4 PTE24 (hiz)

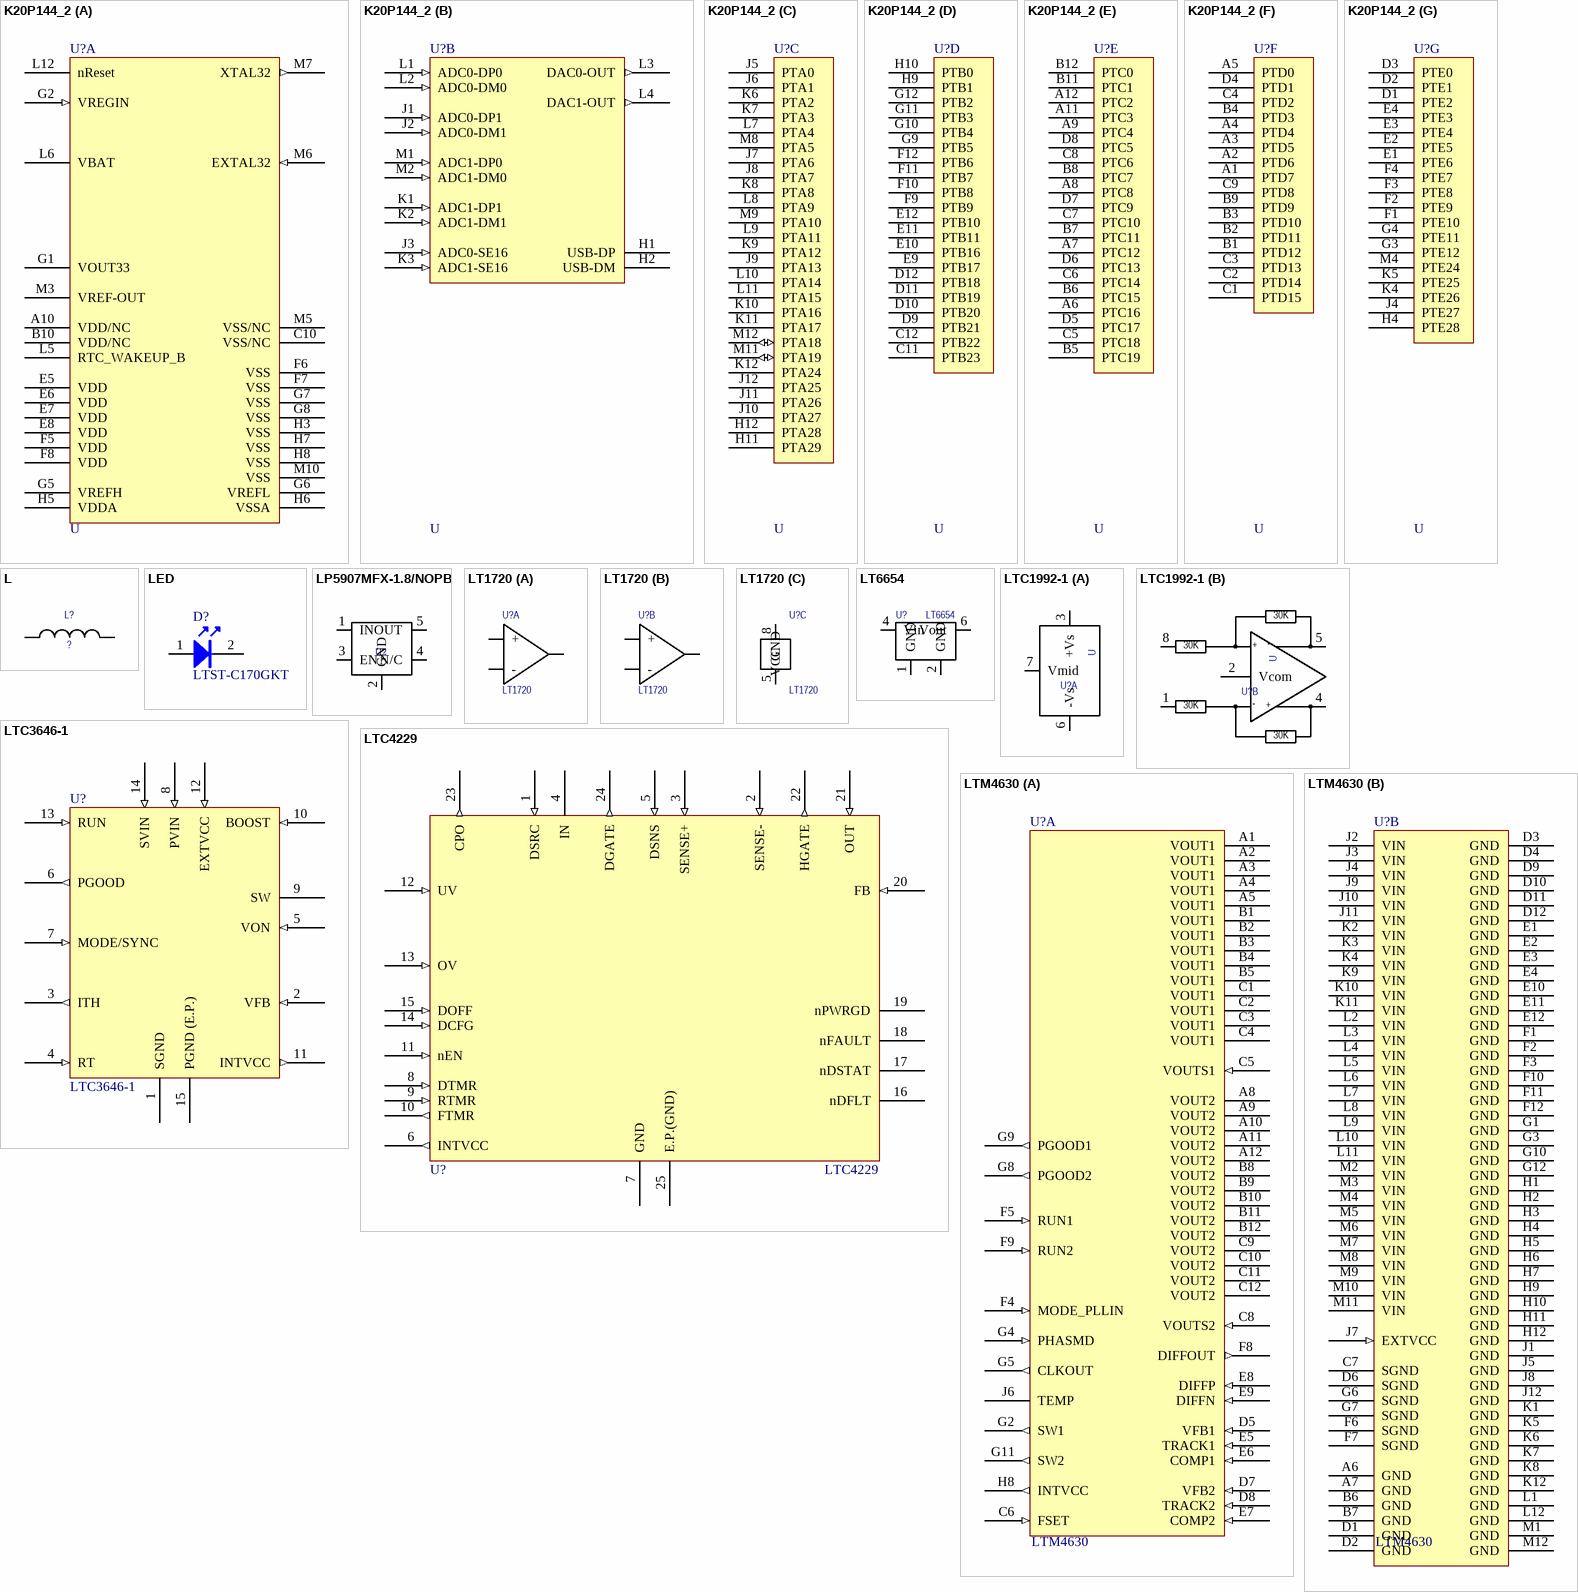
[diagram p9: symbols K20P144_2 to LTM4630]

## K20P144_2
designator U?, comment U